# Altium footprint library 13-IC Packages-1bga.PcbLib: 97 footprints (part 13 of 14)
Each footprint in its own frame and in the unit in brackets; x right, y up, seen from the top. Pads: shape width x height; smd on the part's side, far side on the other; paste and mask are expansions set on the pad; w line width, h text height; cw(c..) or ccw(c..) is an arc to the next point about the centre after c.
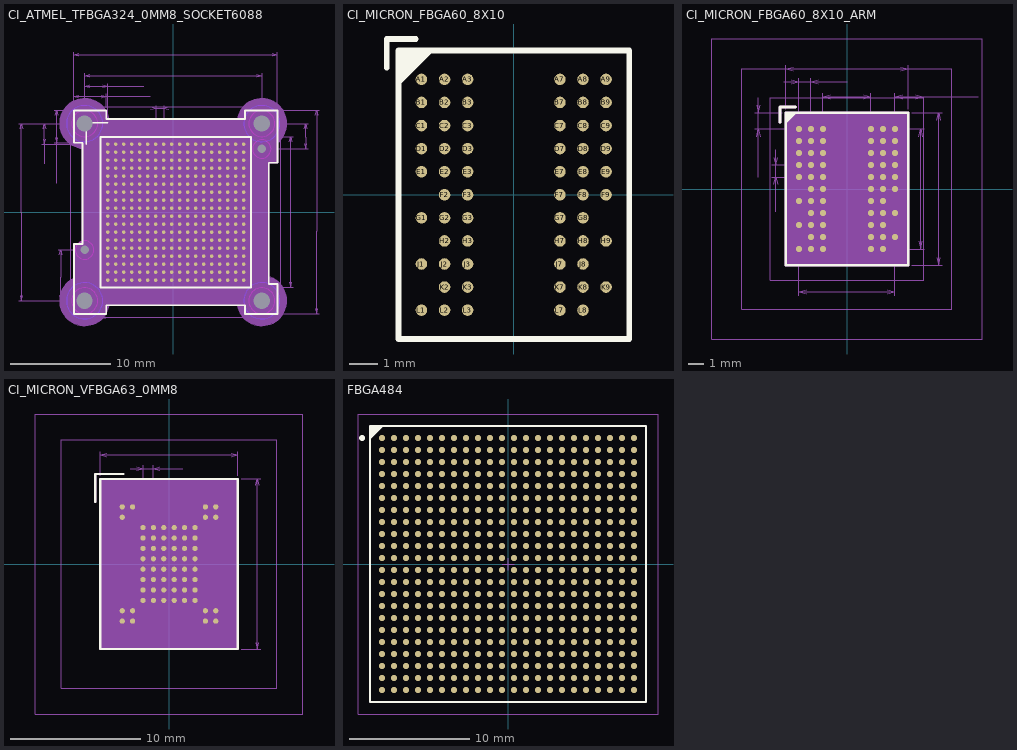
[diagram p12: the footprints below, top view; thin cyan lines are the x and y axes]

## CI_ATMEL_TFBGA324_0MM8_SOCKET6088 [mm]
height 25.75
pads (330):
  round 1 / inner round 1.61 / far side round 1 hole 1.61: " "(-8.863,-8.863) " "(-8.863,8.863) " "(8.863,-8.863) " "(8.863,8.863)
  round 0.5 / inner round 0.85 / far side round 0.5 hole 0.85: " "(-8.863,-3.783) " "(8.862,6.323)
  round 0.35 smd: A1(-6.553,6.8) A2(-5.753,6.8) A3(-4.953,6.8) A4(-4.152,6.8) A5(-3.353,6.8) A6(-2.553,6.8) A7(-1.752,6.8) A8(-0.953,6.8) A9(-0.153,6.8) A10(0.647,6.8) A11(1.448,6.8) A12(2.247,6.8) A13(3.047,6.8) A14(3.848,6.8) A15(4.647,6.8) A16(5.447,6.8) A17(6.247,6.8) A18(7.048,6.8) B1(-6.553,6) B2(-5.753,6) B3(-4.953,6) B4(-4.152,6) B5(-3.352,6) B6(-2.553,6) B7(-1.753,6) B8(-0.953,6) B9(-0.153,6) B10(0.647,6) B11(1.448,6) B12(2.248,6) B13(3.047,6) B14(3.847,6) B15(4.647,6) B16(5.447,6) B17(6.248,6) B18(7.048,6) C1(-6.553,5.2) C2(-5.753,5.2) C3(-4.953,5.2) C4(-4.152,5.2) C5(-3.352,5.2) C6(-2.553,5.2) C7(-1.753,5.2) C8(-0.953,5.2) C9(-0.153,5.2) C10(0.647,5.2) C11(1.448,5.2) C12(2.248,5.2) C13(3.047,5.2) C14(3.847,5.2) C15(4.647,5.2) C16(5.447,5.2) C17(6.247,5.2) C18(7.048,5.2) D1(-6.553,4.4) D2(-5.753,4.4) D3(-4.953,4.4) D4(-4.152,4.4) D5(-3.353,4.4) D6(-2.553,4.4) D7(-1.752,4.4) D8(-0.953,4.4) D9(-0.153,4.4) D10(0.647,4.4) D11(1.448,4.4) D12(2.247,4.4) D13(3.047,4.4) D14(3.848,4.4) D15(4.647,4.4) D16(5.447,4.4) D17(6.248,4.4) D18(7.048,4.4) E1(-6.552,3.6) E2(-5.753,3.6) E3(-4.953,3.6) E4(-4.153,3.6) E5(-3.353,3.6) E6(-2.553,3.6) E7(-1.752,3.6) E8(-0.952,3.6) E9(-0.153,3.6) E10(0.647,3.6) E11(1.447,3.6) E12(2.247,3.6) E13(3.047,3.6) E14(3.848,3.6) E15(4.648,3.6) E16(5.447,3.6) E17(6.247,3.6) E18(7.047,3.6) F1(-6.552,2.8) F2(-5.752,2.8) F3(-4.953,2.8) F4(-4.153,2.8) F5(-3.353,2.8) F6(-2.553,2.8) F7(-1.752,2.8) F8(-0.952,2.8) F9(-0.152,2.8) F10(0.647,2.8) F11(1.447,2.8) F12(2.247,2.8) F13(3.047,2.8) F14(3.848,2.8) F15(4.648,2.8) F16(5.448,2.8) F17(6.247,2.8) F18(7.047,2.8) G1(-6.552,2) G2(-5.753,2) G3(-4.953,2) G4(-4.153,2) G5(-3.353,2) G6(-2.553,2) G7(-1.752,2) G8(-0.952,2) G9(-0.153,2) G10(0.647,2) G11(1.447,2) G12(2.247,2) G13(3.047,2) G14(3.848,2) G15(4.648,2) G16(5.447,2) G17(6.247,2) G18(7.047,2) H1(-6.553,1.2) H2(-5.753,1.2) H3(-4.953,1.2) H4(-4.152,1.2) H5(-3.353,1.2) H6(-2.553,1.2) H7(-1.752,1.2) H8(-0.953,1.2) H9(-0.153,1.2) H10(0.647,1.2) H11(1.448,1.2) H12(2.247,1.2) H13(3.047,1.2) H14(3.848,1.2) H15(4.647,1.2) H16(5.447,1.2) H17(6.247,1.2) H18(7.048,1.2) J1(-6.553,0.4) J2(-5.753,0.4) J3(-4.953,0.4) J4(-4.152,0.4) J5(-3.352,0.4) J6(-2.553,0.4) J7(-1.753,0.4) J8(-0.953,0.4) J9(-0.153,0.4) J10(0.647,0.4) J11(1.448,0.4) J12(2.248,0.4) J13(3.047,0.4) J14(3.847,0.4) J15(4.647,0.4) J16(5.447,0.4) J17(6.247,0.4) J18(7.048,0.4) K1(-6.553,-0.4) K2(-5.753,-0.4) K3(-4.953,-0.4) K4(-4.152,-0.4) K5(-3.352,-0.4) K6(-2.553,-0.4) K7(-1.753,-0.4) K8(-0.953,-0.4) K9(-0.153,-0.4) K10(0.647,-0.4) K11(1.448,-0.4) K12(2.248,-0.4) K13(3.047,-0.4) K14(3.847,-0.4) K15(4.647,-0.4) K16(5.447,-0.4) K17(6.248,-0.4) K18(7.048,-0.4) L1(-6.553,-1.2) L2(-5.753,-1.2) L3(-4.953,-1.2) L4(-4.152,-1.2) L5(-3.353,-1.2) L6(-2.553,-1.2) L7(-1.752,-1.2) L8(-0.953,-1.2) L9(-0.153,-1.2) L10(0.647,-1.2) L11(1.448,-1.2) L12(2.247,-1.2) L13(3.047,-1.2) L14(3.848,-1.2) L15(4.647,-1.2) L16(5.447,-1.2) L17(6.247,-1.2) L18(7.048,-1.2) M1(-6.552,-2) M2(-5.753,-2) M3(-4.953,-2) M4(-4.153,-2) M5(-3.353,-2) M6(-2.553,-2) M7(-1.752,-2) M8(-0.952,-2) M9(-0.153,-2) M10(0.647,-2) M11(1.447,-2) M12(2.247,-2) M13(3.047,-2) M14(3.848,-2) M15(4.648,-2) M16(5.447,-2) M17(6.248,-2) M18(7.047,-2) N1(-6.552,-2.8) N2(-5.752,-2.8) N3(-4.953,-2.8) N4(-4.153,-2.8) N5(-3.353,-2.8) N6(-2.553,-2.8) N7(-1.752,-2.8) N8(-0.952,-2.8) N9(-0.152,-2.8) N10(0.647,-2.8) N11(1.447,-2.8) N12(2.247,-2.8) N13(3.047,-2.8) N14(3.848,-2.8) N15(4.648,-2.8) N16(5.448,-2.8) N17(6.247,-2.8) N18(7.047,-2.8) P1(-6.552,-3.6) P2(-5.753,-3.6) P3(-4.953,-3.6) P4(-4.153,-3.6) P5(-3.353,-3.6) P6(-2.553,-3.6) P7(-1.752,-3.6) P8(-0.952,-3.6) P9(-0.153,-3.6) P10(0.647,-3.6) P11(1.447,-3.6) P12(2.247,-3.6) P13(3.047,-3.6) P14(3.848,-3.6) P15(4.648,-3.6) P16(5.447,-3.6) P17(6.247,-3.6) P18(7.047,-3.6) R1(-6.553,-4.4) R2(-5.753,-4.4) R3(-4.953,-4.4) R4(-4.152,-4.4) R5(-3.353,-4.4) R6(-2.553,-4.4) R7(-1.752,-4.4) R8(-0.953,-4.4) R9(-0.153,-4.4) R10(0.647,-4.4) R11(1.448,-4.4) R12(2.247,-4.4) R13(3.047,-4.4) R14(3.848,-4.4) R15(4.647,-4.4) R16(5.447,-4.4) R17(6.247,-4.4) R18(7.048,-4.4) T1(-6.553,-5.2) T2(-5.753,-5.2) T3(-4.953,-5.2) T4(-4.152,-5.2) T5(-3.352,-5.2) T6(-2.553,-5.2) T7(-1.753,-5.2) T8(-0.953,-5.2) T9(-0.153,-5.2) T10(0.647,-5.2) T11(1.448,-5.2) T12(2.248,-5.2) T13(3.047,-5.2) T14(3.847,-5.2) T15(4.647,-5.2) T16(5.447,-5.2) T17(6.247,-5.2) T18(7.048,-5.2) U1(-6.553,-6) U2(-5.753,-6) U3(-4.953,-6) U4(-4.152,-6) U5(-3.352,-6) U6(-2.553,-6) U7(-1.753,-6) U8(-0.953,-6) U9(-0.153,-6) U10(0.647,-6) U11(1.448,-6) U12(2.248,-6) U13(3.047,-6) U14(3.847,-6) U15(4.647,-6) U16(5.447,-6) U17(6.247,-6) U18(7.048,-6) V1(-6.553,-6.8) V2(-5.753,-6.8) V3(-4.953,-6.8) V4(-4.152,-6.8) V5(-3.353,-6.8) V6(-2.553,-6.8) V7(-1.752,-6.8) V8(-0.953,-6.8) V9(-0.153,-6.8) V10(0.647,-6.8) V11(1.448,-6.8) V12(2.247,-6.8) V13(3.047,-6.8) V14(3.848,-6.8) V15(4.647,-6.8) V16(5.447,-6.8) V17(6.247,-6.8) V18(7.048,-6.8)
Top Layer keep-out:
  circle w0.025: c-8.863,-8.863 r1.805
  circle w0.025: c8.863,-8.863 r1.805
  circle w0.025: c8.863,8.863 r1.805
  circle w0.025: c-8.863,8.863 r1.805
Bottom Layer keep-out:
  circle w0.025: c-8.863,-8.863 r1.805
  circle w0.025: c8.863,-8.863 r1.805
  circle w0.025: c8.863,8.863 r1.805
  circle w0.025: c-8.863,8.863 r1.805
Top Overlay:
  lines w0.18: -8.703,6.8 -8.703,8.95 -6.552,8.95 ; -9.927,-10.175 -9.927,-3.185 -9.062,-3.185 -9.062,6.94 -9.927,6.94 -9.927,10.175 -6.692,10.175 -6.693,9.31 7.188,9.31 7.187,10.175 10.422,10.175 10.422,4.94 9.558,4.94 9.557,-7.185 10.422,-7.185 10.422,-10.175 7.187,-10.175 7.188,-9.31 -6.693,-9.31 -6.692,-10.175 -9.927,-10.175 ; -7.278,-7.525 -7.278,7.525 7.773,7.525 7.773,-7.525 -7.278,-7.525
Top Solder:
  drawing of 6 lines, arcs and shapes, not listed
Bottom Solder:
  drawing of 6 lines, arcs and shapes, not listed
Mechanical 6:
  lines w0.18: -8.703,6.8 -8.703,8.089 ; -8.077,8.95 -6.552,8.95 ; -9.927,-10.175 -9.927,-3.185 -9.062,-3.185 -9.062,6.94 -9.927,6.94 -9.927,10.175 -6.692,10.175 -6.693,9.31 7.188,9.31 7.187,10.175 10.422,10.175 10.422,4.94 9.558,4.94 9.557,-7.185 10.422,-7.185 10.422,-10.175 7.187,-10.175 7.188,-9.31 -6.693,-9.31 -6.692,-10.175 -9.927,-10.175 ; -7.278,-7.525 -7.278,7.525 7.773,7.525 7.773,-7.525 -7.278,-7.525
Mechanical 8:
  lines w0.025: -15.428,-8.865 -9.112,-8.865 -12.982,-8.865 ; -15.428,8.86 -9.113,8.86 -13.128,8.86 ; -15.303,-8.365 -15.177,-8.865 ; -15.302,8.36 -15.178,8.86 ; -15.053,-8.365 -15.177,-8.865 ; -15.052,8.36 -15.178,8.86 ; -13.128,6.8 -6.803,6.8 ; -13.002,7.3 -12.878,6.8 ; -13.003,8.36 -12.877,8.86 ; -12.877,4.853 -12.878,6.8 ; -12.753,7.3 -12.878,6.8 ; -12.753,8.36 -12.877,8.86 ; -11.923,6.94 -10.178,6.94 ; -11.923,10.175 -10.178,10.175 ; -11.798,7.44 -11.672,6.94 ; -11.798,9.675 -11.672,10.175 ; -11.673,2.89 -11.672,6.94 ; -11.548,7.44 -11.672,6.94 ; -11.548,9.675 -11.672,10.175 ; -11.503,-8.862 -9.113,-8.863 ; -11.503,-3.782 -9.113,-3.783 ; -11.377,-8.363 -11.253,-8.863 ; -11.377,-4.283 -11.253,-3.783 ; -11.128,-8.362 -11.253,-8.863 ; -11.128,-4.282 -11.253,-3.783 ; -9.927,11.83 -9.927,10.425 -9.927,16.01 ; -9.428,11.455 -9.927,11.58 ; -9.427,11.705 -9.927,11.58 ; -9.428,15.635 -9.927,15.76 ; -9.428,15.885 -9.927,15.76 ; -8.863,12.85 -8.863,9.11 -8.863,13.915 ; -8.362,12.475 -8.863,12.6 ; -8.363,12.725 -8.863,12.6 ; -8.363,13.54 -8.863,13.665 ; -8.363,13.79 -8.863,13.665 ; -7.278,-10.75 -7.277,-7.775 ; -7.193,11.455 -6.692,11.58 ; -7.193,11.705 -6.692,11.58 ; -7.052,12.475 -6.553,12.6 ; -7.052,12.725 -6.553,12.6 ; -6.777,-10.625 -7.278,-10.5 ; -6.778,-10.375 -7.278,-10.5 ; -6.692,10.425 -6.692,11.83 ; -6.552,7.05 -6.552,12.85 ; -2.965,12.6 -6.553,12.6 ; -2.277,11.58 -6.692,11.58 ; -2.252,10.295 -1.753,10.42 ; -2.252,10.545 -1.753,10.42 ; -1.752,7.05 -1.752,10.67 ; -0.952,7.05 -0.953,10.67 ; -0.452,10.295 -0.953,10.42 ; -0.452,10.545 -0.953,10.42 ; 7.272,-10.625 7.773,-10.5 ; 7.273,-10.375 7.773,-10.5 ; 7.773,-10.75 7.772,-7.775 ; 8.022,-7.525 11.997,-7.525 ; 8.022,7.525 11.997,7.525 ; 8.362,13.54 8.862,13.665 ; 8.363,13.79 8.862,13.665 ; 8.863,9.11 8.862,13.915 ; 9.112,6.323 13.497,6.322 ; 9.112,8.862 13.497,8.863 ; 9.922,15.635 10.422,15.76 ; 9.922,15.885 10.422,15.76 ; 10.422,10.425 10.422,16.01 ; 10.673,-10.175 14.587,-10.175 ; 10.673,10.175 14.587,10.175 ; 11.623,-7.025 11.747,-7.525 ; 11.623,7.025 11.747,7.525 ; 11.872,-7.025 11.747,-7.525 ; 11.872,7.025 11.747,7.525 ; 13.122,6.822 13.248,6.323 ; 13.122,8.363 13.248,8.862 ; 13.372,6.823 13.248,6.323 ; 13.373,8.363 13.248,8.862 ; 14.212,-9.675 14.337,-10.175 ; 14.212,9.675 14.337,10.175 ; 14.463,-9.675 14.337,-10.175 ; 14.463,9.675 14.337,10.175 ; -15.177,-8.865 -15.178,-0.05 -15.178,8.86 ; -12.878,6.8 -12.877,8.86 ; -12.878,6.8 -12.877,8.86 ; -11.672,6.94 -11.672,10.175 ; -11.672,6.94 -11.672,10.175 ; -11.253,-8.863 -11.252,-6.5 -11.253,-3.783 ; -9.927,11.58 -6.692,11.58 ; -9.927,11.58 -6.692,11.58 ; -9.927,15.76 -0.332,15.76 10.422,15.76 ; -8.863,12.6 -6.553,12.6 ; -8.863,12.6 -6.553,12.6 ; -8.863,13.665 1.088,13.665 8.862,13.665 ; -7.278,-10.5 -0.253,-10.5 7.773,-10.5 ; -1.753,10.42 -1.188,10.42 -0.953,10.42 ; 11.747,-7.525 11.747,-1 11.747,7.525 ; 13.248,6.323 13.248,7.5 13.248,8.862 ; 14.337,-10.175 14.338,-1.925 14.337,10.175
  text "17.725" at -15.428,-1.413 h0.5
  text "2.31" at -5.115,12.85 h0.5
  text "17.725" at -0.275,13.915 h0.5
  text "2.06" at -13.128,5.227 h0.5
  text "20.35" at -1.457,16.01 h0.5
  text "20.35" at 14.087,-3.05 h0.5
  text "0.8" at -1.837,10.67 h0.5
  text "3.235" at -11.923,3.265 h0.5
  text "3.235" at -4.903,11.83 h0.5
  text "15.05" at 11.497,-2.125 h0.5
  text "2.54" at 12.563,6.613 h0.5
Mechanical 16:
  drawing of 43 lines, arcs and shapes, not listed
Multi-Layer keep-out:
  circle w0.025: c-8.863,-8.863 r1.305
  circle w0.025: c8.863,-8.863 r1.305
  circle w0.025: c8.863,8.863 r1.305
  circle w0.025: c-8.863,8.863 r1.305
  circle w0.025: c-8.863,-3.783 r0.925
  circle w0.025: c8.862,6.323 r0.925
Mechanical 18:
  text "V5" at -3.211,-6.659 h0.25
  text "N7" at -1.611,-2.659 h0.25
  text "T6" at -2.411,-5.059 h0.25
  text "U6" at -2.411,-5.859 h0.25
  text "E4" at -4.011,3.741 h0.25
  text "B9" at -0.011,6.141 h0.25
  text "R11" at 1.66,-4.188 h0.25
  text "U10" at 0.86,-5.788 h0.25
  text "V10" at 0.86,-6.588 h0.25
  text "N10" at 0.86,-2.588 h0.25
  text "P10" at 0.86,-3.388 h0.25
  text "R10" at 0.86,-4.188 h0.25
  text "U15" at 4.86,-5.788 h0.25
  text "T17" at 6.46,-4.988 h0.25
  text "R17" at 6.46,-4.188 h0.25
  text "U16" at 5.66,-5.788 h0.25
  text "E17" at 6.46,3.812 h0.25
  text "F16" at 5.66,3.012 h0.25
  text "F17" at 6.46,3.012 h0.25
  text "E14" at 4.06,3.812 h0.25
  text "F15" at 4.86,3.012 h0.25
  text "F18" at 7.26,3.012 h0.25
  text "F14" at 4.06,3.012 h0.25
  text "F13" at 3.26,3.012 h0.25
  text "M14" at 4.06,-1.788 h0.25
  text "L13" at 3.26,-0.988 h0.25
  text "L12" at 2.46,-0.988 h0.25
  text "K13" at 3.26,-0.188 h0.25
  text "C3" at -4.811,5.341 h0.25
  text "G11" at 1.66,2.212 h0.25
  text "G10" at 0.86,2.212 h0.25
  text "F6" at -2.411,2.941 h0.25
  text "D16" at 5.66,4.612 h0.25
  text "H3" at -4.811,1.341 h0.25
  text "H11" at 1.66,1.412 h0.25
  text "E18" at 7.26,3.812 h0.25
  text "G13" at 3.26,2.212 h0.25
  text "G12" at 2.46,2.212 h0.25
  text "D4" at -4.011,4.541 h0.25
  text "V13" at 3.26,-6.588 h0.25
  text "K10" at 0.86,-0.188 h0.25
  text "K9" at -0.011,-0.259 h0.25
  text "C2" at -5.611,5.341 h0.25
  text "P11" at 1.66,-3.388 h0.25
  text "V17" at 6.46,-6.588 h0.25
  text "U11" at 1.66,-5.788 h0.25
  text "E3" at -4.811,3.741 h0.25
  text "U18" at 7.26,-5.788 h0.25
  text "J15" at 4.86,0.612 h0.25
  text "J14" at 4.06,0.612 h0.25
  text "K17" at 6.46,-0.188 h0.25
  text "K18" at 7.26,-0.188 h0.25
  text "K16" at 5.66,-0.188 h0.25
  text "K15" at 4.86,-0.188 h0.25
  text "K14" at 4.06,-0.188 h0.25
  text "L17" at 6.46,-0.988 h0.25
  text "L18" at 7.26,-0.988 h0.25
  text "L16" at 5.66,-0.988 h0.25
  text "L15" at 4.86,-0.988 h0.25
  text "A16" at 5.66,7.012 h0.25
  text "M18" at 7.26,-1.788 h0.25
  text "L14" at 4.06,-0.988 h0.25
  text "M17" at 6.46,-1.788 h0.25
  text "K12" at 2.46,-0.188 h0.25
  text "K11" at 1.66,-0.188 h0.25
  text "J11" at 1.66,0.612 h0.25
  text "J10" at 0.86,0.612 h0.25
  text "J9" at -0.011,0.541 h0.25
  text "H12" at 2.46,1.412 h0.25
  text "H10" at 0.86,1.412 h0.25
  text "H9" at -0.011,1.341 h0.25
  text "G9" at -0.011,2.141 h0.25
  text "U17" at 6.46,-5.788 h0.25
  text "U12" at 2.46,-5.788 h0.25
  text "J13" at 3.26,0.612 h0.25
  text "J12" at 2.46,0.612 h0.25
  text "H13" at 3.26,1.412 h0.25
  text "D3" at -4.811,4.541 h0.25
  text "C16" at 5.66,5.412 h0.25
  text "E8" at -0.811,3.741 h0.25
  text "E5" at -3.211,3.741 h0.25
  text "M16" at 5.66,-1.788 h0.25
  text "M15" at 4.86,-1.788 h0.25
  text "N14" at 4.06,-2.588 h0.25
  text "N18" at 7.26,-2.588 h0.25
  text "N17" at 6.46,-2.588 h0.25
  text "P18" at 7.26,-3.388 h0.25
  text "N16" at 5.66,-2.588 h0.25
  text "P9" at -0.011,-3.459 h0.25
  text "N15" at 4.86,-2.588 h0.25
  text "P14" at 4.06,-3.388 h0.25
  text "R14" at 4.06,-4.188 h0.25
  text "P17" at 6.46,-3.388 h0.25
  text "P16" at 5.66,-3.388 h0.25
  text "P15" at 4.86,-3.388 h0.25
  text "T14" at 4.06,-4.988 h0.25
  text "R15" at 4.86,-4.188 h0.25
  text "R16" at 5.66,-4.188 h0.25
  text "F8" at -0.811,2.941 h0.25
  text "G3" at -4.811,2.141 h0.25
  text "G7" at -1.611,2.141 h0.25
  text "V18" at 7.26,-6.588 h0.25
  text "F5" at -3.211,2.941 h0.25
  text "H5" at -3.211,1.341 h0.25
  text "G5" at -3.211,2.141 h0.25
  text "F4" at -4.011,2.941 h0.25
  text "G4" at -4.011,2.141 h0.25
  text "L2" at -5.611,-1.059 h0.25
  text "J7" at -1.611,0.541 h0.25
  text "K1" at -6.411,-0.259 h0.25
  text "L3" at -4.811,-1.059 h0.25
  text "K7" at -1.611,-0.259 h0.25
  text "K2" at -5.611,-0.259 h0.25
  text "T4" at -4.011,-5.059 h0.25
  text "J8" at -0.811,0.541 h0.25
  text "K5" at -3.211,-0.259 h0.25
  text "L6" at -2.411,-1.059 h0.25
  text "K8" at -0.811,-0.259 h0.25
  text "K4" at -4.011,-0.259 h0.25
  text "T3" at -4.811,-5.059 h0.25
  text "K6" at -2.411,-0.259 h0.25
  text "T2" at -5.611,-5.059 h0.25
  text "P5" at -3.211,-3.459 h0.25
  text "J1" at -6.411,0.541 h0.25
  text "M2" at -5.611,-1.859 h0.25
  text "K3" at -4.811,-0.259 h0.25
  text "J6" at -2.411,0.541 h0.25
  text "L5" at -3.211,-1.059 h0.25
  text "J4" at -4.011,0.541 h0.25
  text "N1" at -6.411,-2.659 h0.25
  text "J2" at -5.611,0.541 h0.25
  text "T1" at -6.411,-5.059 h0.25
  text "H4" at -4.011,1.341 h0.25
  text "M1" at -6.411,-1.859 h0.25
  text "J3" at -4.811,0.541 h0.25
  text "R3" at -4.811,-4.259 h0.25
  text "H6" at -2.411,1.341 h0.25
  text "H7" at -1.611,1.341 h0.25
  text "G8" at -0.811,2.141 h0.25
  text "L4" at -4.011,-1.059 h0.25
  text "J5" at -3.211,0.541 h0.25
  text "P8" at -0.811,-3.459 h0.25
  text "G6" at -2.411,2.141 h0.25
  text "H8" at -0.811,1.341 h0.25
  text "N8" at -0.811,-2.659 h0.25
  text "U7" at -1.611,-5.859 h0.25
  text "H2" at -5.611,1.341 h0.25
  text "T18" at 7.26,-4.988 h0.25
  text "A7" at -1.611,6.941 h0.25
  text "P7" at -1.611,-3.459 h0.25
  text "T13" at 3.26,-4.988 h0.25
  text "R13" at 3.26,-4.188 h0.25
  text "M7" at -1.611,-1.859 h0.25
  text "R18" at 7.26,-4.188 h0.25
  text "P13" at 3.26,-3.388 h0.25
  text "U5" at -3.211,-5.859 h0.25
  text "T5" at -3.211,-5.059 h0.25
  text "N9" at -0.011,-2.659 h0.25
  text "R5" at -3.211,-4.259 h0.25
  text "V6" at -2.411,-6.659 h0.25
  text "M11" at 1.66,-1.788 h0.25
  text "R6" at -2.411,-4.259 h0.25
  text "U13" at 3.26,-5.788 h0.25
  text "N11" at 1.66,-2.588 h0.25
  text "M8" at -0.811,-1.859 h0.25
  text "V4" at -4.011,-6.659 h0.25
  text "T12" at 2.46,-4.988 h0.25
  text "M13" at 3.26,-1.788 h0.25
  text "L8" at -0.811,-1.059 h0.25
  text "U14" at 4.06,-5.788 h0.25
  text "T11" at 1.66,-4.988 h0.25
  text "M12" at 2.46,-1.788 h0.25
  text "N12" at 2.46,-2.588 h0.25
  text "T16" at 5.66,-4.988 h0.25
  text "R12" at 2.46,-4.188 h0.25
  text "T15" at 4.86,-4.988 h0.25
  text "P12" at 2.46,-3.388 h0.25
  text "E10" at 0.86,3.812 h0.25
  text "N13" at 3.26,-2.588 h0.25
  text "D10" at 0.86,4.612 h0.25
  text "F11" at 1.66,3.012 h0.25
  text "A10" at 0.86,7.012 h0.25
  text "C9" at -0.011,5.341 h0.25
  text "A12" at 2.46,7.012 h0.25
  text "D11" at 1.66,4.612 h0.25
  text "B11" at 1.66,6.212 h0.25
  text "E11" at 1.66,3.812 h0.25
  text "A11" at 1.66,7.012 h0.25
  text "C11" at 1.66,5.412 h0.25
  text "A14" at 4.06,7.012 h0.25
  text "F12" at 2.46,3.012 h0.25
  text "V15" at 4.86,-6.588 h0.25
  text "F10" at 0.86,3.012 h0.25
  text "B12" at 2.46,6.212 h0.25
  text "A13" at 3.26,7.012 h0.25
  text "V12" at 2.46,-6.588 h0.25
  text "G15" at 4.86,2.212 h0.25
  text "R8" at -0.811,-4.259 h0.25
  text "H16" at 5.66,1.412 h0.25
  text "R2" at -5.611,-4.259 h0.25
  text "G14" at 4.06,2.212 h0.25
  text "V16" at 5.66,-6.588 h0.25
  text "G18" at 7.26,2.212 h0.25
  text "V11" at 1.66,-6.588 h0.25
  text "H17" at 6.46,1.412 h0.25
  text "J17" at 6.46,0.612 h0.25
  text "H15" at 4.86,1.412 h0.25
  text "M10" at 0.86,-1.788 h0.25
  text "H14" at 4.06,1.412 h0.25
  text "H18" at 7.26,1.412 h0.25
  text "J18" at 7.26,0.612 h0.25
  text "G16" at 5.66,2.212 h0.25
  text "G17" at 6.46,2.212 h0.25
  text "J16" at 5.66,0.612 h0.25
  text "V7" at -1.611,-6.659 h0.25
  text "F9" at -0.011,2.941 h0.25
  text "R7" at -1.611,-4.259 h0.25
  text "C8" at -0.811,5.341 h0.25
  text "B8" at -0.811,6.141 h0.25
  text "L9" at -0.011,-1.059 h0.25
  text "T9" at -0.011,-5.059 h0.25
  text "E1" at -6.411,3.741 h0.25
  text "F1" at -6.411,2.941 h0.25
  text "E2" at -5.611,3.741 h0.25
  text "G2" at -5.611,2.141 h0.25
  text "F3" at -4.811,2.941 h0.25
  text "V1" at -6.411,-6.659 h0.25
  text "D2" at -5.611,4.541 h0.25
  text "L10" at 0.86,-0.988 h0.25
  text "M9" at -0.011,-1.859 h0.25
  text "U4" at -4.011,-5.859 h0.25
  text "U9" at -0.011,-5.859 h0.25
  text "U1" at -6.411,-5.859 h0.25
  text "V3" at -4.811,-6.659 h0.25
  text "P4" at -4.011,-3.459 h0.25
  text "T7" at -1.611,-5.059 h0.25
  text "U2" at -5.611,-5.859 h0.25
  text "U3" at -4.811,-5.859 h0.25
  text "L1" at -6.411,-1.059 h0.25
  text "U8" at -0.811,-5.859 h0.25
  text "G1" at -6.411,2.141 h0.25
  text "N6" at -2.411,-2.659 h0.25
  text "V2" at -5.611,-6.659 h0.25
  text "R4" at -4.011,-4.259 h0.25
  text "P3" at -4.811,-3.459 h0.25
  text "R1" at -6.411,-4.259 h0.25
  text "N5" at -3.211,-2.659 h0.25
  text "N3" at -4.811,-2.659 h0.25
  text "N2" at -5.611,-2.659 h0.25
  text "V8" at -0.811,-6.659 h0.25
  text "P2" at -5.611,-3.459 h0.25
  text "M6" at -2.411,-1.859 h0.25
  text "M5" at -3.211,-1.859 h0.25
  text "T10" at 0.86,-4.988 h0.25
  text "P1" at -6.411,-3.459 h0.25
  text "L11" at 1.66,-0.988 h0.25
  text "N4" at -4.011,-2.659 h0.25
  text "T8" at -0.811,-5.059 h0.25
  text "L7" at -1.611,-1.059 h0.25
  text "R9" at -0.011,-4.259 h0.25
  text "M4" at -4.011,-1.859 h0.25
  text "F2" at -5.611,2.941 h0.25
  text "M3" at -4.811,-1.859 h0.25
  text "H1" at -6.411,1.341 h0.25
  text "C12" at 2.46,5.412 h0.25
  text "D12" at 2.46,4.612 h0.25
  text "D1" at -6.411,4.541 h0.25
  text "V9" at -0.011,-6.659 h0.25
  text "E12" at 2.46,3.812 h0.25
  text "B13" at 3.26,6.212 h0.25
  text "E13" at 3.26,3.812 h0.25
  text "C1" at -6.411,5.341 h0.25
  text "C13" at 3.26,5.412 h0.25
  text "D13" at 3.26,4.612 h0.25
  text "P6" at -2.411,-3.459 h0.25
  text "B14" at 4.06,6.212 h0.25
  text "A15" at 4.86,7.012 h0.25
  text "C14" at 4.06,5.412 h0.25
  text "D14" at 4.06,4.612 h0.25
  text "B15" at 4.86,6.212 h0.25
  text "B16" at 5.66,6.212 h0.25
  text "V14" at 4.06,-6.588 h0.25
  text "C15" at 4.86,5.412 h0.25
  text "D15" at 4.86,4.612 h0.25
  text "A17" at 6.46,7.012 h0.25
  text "C17" at 6.46,5.412 h0.25
  text "B10" at 0.86,6.212 h0.25
  text "C10" at 0.86,5.412 h0.25
  text "B17" at 6.46,6.212 h0.25
  text "A18" at 7.26,7.012 h0.25
  text "B18" at 7.26,6.212 h0.25
  text "C18" at 7.26,5.412 h0.25
  text "D17" at 6.46,4.612 h0.25
  text "D18" at 7.26,4.612 h0.25
  text "E16" at 5.66,3.812 h0.25
  text "E15" at 4.86,3.812 h0.25
  text "A9" at -0.011,6.941 h0.25
  text "D9" at -0.011,4.541 h0.25
  text "C7" at -1.611,5.341 h0.25
  text "A6" at -2.411,6.941 h0.25
  text "D8" at -0.811,4.541 h0.25
  text "B1" at -6.411,6.141 h0.25
  text "B3" at -4.811,6.141 h0.25
  text "B2" at -5.611,6.141 h0.25
  text "A2" at -5.611,6.941 h0.25
  text "A1" at -6.411,6.941 h0.25
  text "C4" at -4.011,5.341 h0.25
  text "A3" at -4.811,6.941 h0.25
  text "D5" at -3.211,4.541 h0.25
  text "E6" at -2.411,3.741 h0.25
  text "B4" at -4.011,6.141 h0.25
  text "C5" at -3.211,5.341 h0.25
  text "A4" at -4.011,6.941 h0.25
  text "F7" at -1.611,2.941 h0.25
  text "D6" at -2.411,4.541 h0.25
  text "B5" at -3.211,6.141 h0.25
  text "E7" at -1.611,3.741 h0.25
  text "C6" at -2.411,5.341 h0.25
  text "D7" at -1.611,4.541 h0.25
  text "A5" at -3.211,6.941 h0.25
  text "B7" at -1.611,6.141 h0.25
  text "B6" at -2.411,6.141 h0.25
  text "E9" at -0.011,3.741 h0.25
  text "A8" at -0.811,6.941 h0.25
Mechanical 20:
  text ".Designator" at 0.772,1.231 h1.12
Mechanical 29:
  text "3MM" at -1.253,-8.5 h0.5
3D body "tfbga-324.stp": height 1.2, standoff 0, extent -7.271,-7.5 7.729,7.5

## CI_MICRON_FBGA60_8X10 [mm]
height 25.75
pads (99):
  round 0.4 smd: A1(-3.2,4) A2(-2.4,4) A3(-1.6,4) A7(1.6,4) A8(2.4,4) A9(3.2,4) B1(-3.2,3.2) B2(-2.4,3.2) B3(-1.6,3.2) B7(1.6,3.2) B8(2.4,3.2) B9(3.2,3.2) C1(-3.2,2.4) C2(-2.4,2.4) C3(-1.6,2.4) C7(1.6,2.4) C8(2.4,2.4) C9(3.2,2.4) D1(-3.2,1.6) D2(-2.4,1.6) D3(-1.6,1.6) D7(1.6,1.6) D8(2.4,1.6) D9(3.2,1.6) E1(-3.2,0.8) E2(-2.4,0.8) E3(-1.6,0.8) E7(1.6,0.8) E8(2.4,0.8) E9(3.2,0.8) F2(-2.4,0) F3(-1.6,0) F7(1.6,0) F8(2.4,0) F9(3.2,0) G1(-3.2,-0.8) G2(-2.4,-0.8) G3(-1.6,-0.8) G7(1.6,-0.8) G8(2.4,-0.8) H2(-2.4,-1.6) H3(-1.6,-1.6) H7(1.6,-1.6) H8(2.4,-1.6) H9(3.2,-1.6) J1(-3.2,-2.4) J2(-2.4,-2.4) J3(-1.6,-2.4) J7(1.6,-2.4) J8(2.4,-2.4) K2(-2.4,-3.2) K3(-1.6,-3.2) K7(1.6,-3.2) K8(2.4,-3.2) K9(3.2,-3.2) L1(-3.2,-4) L2(-2.4,-4) L3(-1.6,-4) L7(1.6,-4) L8(2.4,-4)
  round 0 all layers, no hole: A4(-0.8,4) A5(0,4) A6(0.8,4) B4(-0.8,3.2) B5(0,3.2) B6(0.8,3.2) C4(-0.8,2.4) C5(0,2.4) C6(0.8,2.4) D4(-0.8,1.6) D5(0,1.6) D6(0.8,1.6) E4(-0.8,0.8) E5(0,0.8) E6(0.8,0.8) F1(-3.2,0) F4(-0.8,0) F5(0,0) F6(0.8,0) G4(-0.8,-0.8) G5(0,-0.8) G6(0.8,-0.8) G9(3.2,-0.8) H1(-3.2,-1.6) H4(-0.8,-1.6) H5(0,-1.6) H6(0.8,-1.6) J4(-0.8,-2.4) J5(0,-2.4) J6(0.8,-2.4) J9(3.2,-2.4) K1(-3.2,-3.2) K4(-0.8,-3.2) K5(0,-3.2) K6(0.8,-3.2) L4(-0.8,-4) L5(0,-4) L6(0.8,-4) L9(3.2,-4)
Top Overlay:
  lines w0.2: -4.4,4.4 -4.4,5.4 -3.4,5.4 ; -4,3.9 -2.925,4.975 ; -4,4.5 -3.575,4.925 ; -4,4.65 -3.7,4.95 ; -3.95,4.1 -3.075,4.975 ; -3.95,4.3 -3.3,4.95 ; -3.95,4.85 -3.85,4.95 ; -4,-5 4,-5 4,5 -4,5 -4,-5

## CI_MICRON_FBGA60_8X10_ARM [mm]
height 25.75
pads (60):
  round 0.4 smd: A1(-3.2,4) A2(-2.4,4) A3(-1.6,4) A7(1.6,4) A8(2.4,4) A9(3.2,4) B1(-3.2,3.2) B2(-2.4,3.2) B3(-1.6,3.2) B7(1.6,3.2) B8(2.4,3.2) B9(3.2,3.2) C1(-3.2,2.4) C2(-2.4,2.4) C3(-1.6,2.4) C7(1.6,2.4) C8(2.4,2.4) C9(3.2,2.4) D1(-3.2,1.6) D2(-2.4,1.6) D3(-1.6,1.6) D7(1.6,1.6) D8(2.4,1.6) D9(3.2,1.6) E1(-3.2,0.8) E2(-2.4,0.8) E3(-1.6,0.8) E7(1.6,0.8) E8(2.4,0.8) E9(3.2,0.8) F2(-2.4,0) F3(-1.6,0) F7(1.6,0) F8(2.4,0) F9(3.2,0) G1(-3.2,-0.8) G2(-2.4,-0.8) G3(-1.6,-0.8) G7(1.6,-0.8) G8(2.4,-0.8) H2(-2.4,-1.6) H3(-1.6,-1.6) H7(1.6,-1.6) H8(2.4,-1.6) H9(3.2,-1.6) J1(-3.2,-2.4) J2(-2.4,-2.4) J3(-1.6,-2.4) J7(1.6,-2.4) J8(2.4,-2.4) K2(-2.4,-3.2) K3(-1.6,-3.2) K7(1.6,-3.2) K8(2.4,-3.2) K9(3.2,-3.2) L1(-3.2,-4) L2(-2.4,-4) L3(-1.6,-4) L7(1.6,-4) L8(2.4,-4)
Top Overlay:
  region: -4.089,4.343 -3.378,5.055 -3.378,5.105 -4.064,5.105 -4.089,5.08
  lines w0.18: -4.465,4.445 -4.465,5.465 -3.429,5.465 ; -4.075,-5.075 -4.075,5.075 4.075,5.075 4.075,-5.075 -4.075,-5.075
Mechanical 6:
  lines w0.18: -4.465,4.445 -4.465,5.465 -3.429,5.465 ; -4.075,-5.075 -4.075,5.075 4.075,5.075 4.075,-5.075 -4.075,-5.075
Mechanical 8:
  lines w0.025: -6.15,4 -3.45,4 ; -6.15,5.075 -4.325,5.075 ; -6.025,3.5 -5.9,4 ; -6.025,5.575 -5.9,5.075 ; -5.9,0.8 -5.9,4 ; -5.9,6.075 -5.9,5.075 ; -5.775,3.5 -5.9,4 ; -5.775,5.575 -5.9,5.075 ; -5,0.8 -3.45,0.8 ; -5,1.6 -3.45,1.6 ; -4.875,0.3 -4.75,0.8 ; -4.875,2.1 -4.75,1.6 ; -4.75,-1.525 -4.75,0.8 ; -4.75,2.6 -4.75,1.6 ; -4.625,0.3 -4.75,0.8 ; -4.625,2.1 -4.75,1.6 ; -4.2,7.15 -3.2,7.15 ; -4.075,5.325 -4.075,8.25 ; -3.7,7.025 -3.2,7.15 ; -3.7,7.275 -3.2,7.15 ; -3.575,7.875 -4.075,8 ; -3.575,8.125 -4.075,8 ; -3.2,-7.1 -3.2,-4.25 ; -3.2,4.25 -3.2,7.4 ; -2.7,-6.975 -3.2,-6.85 ; -2.7,-6.725 -3.2,-6.85 ; -2.4,4.25 -2.4,7.4 ; -1.9,7.025 -2.4,7.15 ; -1.9,7.275 -2.4,7.15 ; -1.6,4.25 -1.6,6.4 ; -1.1,6.025 -1.6,6.15 ; -1.1,6.275 -1.6,6.15 ; 0.025,7.15 -2.4,7.15 ; 1.1,6.025 1.6,6.15 ; 1.1,6.275 1.6,6.15 ; 1.6,4.25 1.6,6.4 ; 2.65,-4 5.15,-4 ; 2.7,-6.975 3.2,-6.85 ; 2.7,-6.725 3.2,-6.85 ; 3.2,-7.1 3.2,-3.45 ; 3.2,4.25 3.2,6.4 ; 3.45,4 5.15,4 ; 3.575,7.875 4.075,8 ; 3.575,8.125 4.075,8 ; 3.7,6.025 3.2,6.15 ; 3.7,6.275 3.2,6.15 ; 4.075,5.325 4.075,8.25 ; 4.325,-5.075 6.35,-5.075 ; 4.325,5.075 6.35,5.075 ; 4.575,6.025 5.075,6.15 ; 4.575,6.275 5.075,6.15 ; 4.775,-3.5 4.9,-4 ; 4.775,3.5 4.9,4 ; 5.025,-3.5 4.9,-4 ; 5.025,3.5 4.9,4 ; 5.975,-4.575 6.1,-5.075 ; 5.975,4.575 6.1,5.075 ; 6.225,-4.575 6.1,-5.075 ; 6.225,4.575 6.1,5.075 ; 8.75,6.15 5.075,6.15 ; -5.9,4 -5.9,5.075 ; -4.75,0.8 -4.75,1.6 ; -4.075,8 0.25,8 4.075,8 ; -3.2,-6.85 0,-6.85 3.2,-6.85 ; -3.2,7.15 -2.4,7.15 ; -1.6,6.15 0,6.15 1.6,6.15 ; 3.2,6.15 5.075,6.15 ; 3.2,6.15 5.075,6.15 ; 4.9,-4 4.9,0.8 4.9,4 ; 6.1,-5.075 6.1,-0.1 6.1,5.075
  text "0.8" at -1.65,7.4 h0.5
  text "3.2" at -0.65,6.4 h0.5
  text "1.875" at 6.125,6.4 h0.5
  text "6.4" at -0.65,-6.6 h0.5
  text "10.15" at 5.85,-1.225 h0.5
  text "1.075" at -6.15,1.175 h0.5
  text "8" at 4.65,0.625 h0.5
  text "0.8" at -4.25,-1.5 h0.5
  text "8.15" at -1.188,9.15 h0.5
Mechanical 16:
  circle w0.025: c-3.2,4 r0.4
  region: -4.075,5.075 4.075,5.075 4.075,-5.075 -4.075,-5.075
  lines w0.025: -9,-10 -9,10 9,10 9,-10 -9,-10 ; -7,-8 -7,8 7,8 7,-8 -7,-8 ; -5.1,-6.1 -5.1,6.1 5.1,6.1 5.1,-6.1 -5.1,-6.1 ; -4.075,-5.075 -4.075,5.075 4.075,5.075 4.075,-5.075 -4.075,-5.075
Mechanical 18:
  text "L2" at -2.2,-4 h0.25
  text "L8" at 2.6,-4 h0.25
  text "B3" at -1.4,3.2 h0.25
  text "B7" at 1.8,3.2 h0.25
  text "F7" at 1.8,0 h0.25
  text "G8" at 2.6,-0.8 h0.25
  text "G7" at 1.8,-0.8 h0.25
  text "F3" at -1.4,0 h0.25
  text "F8" at 2.6,0 h0.25
  text "E8" at 2.6,0.8 h0.25
  text "G3" at -1.4,-0.8 h0.25
  text "F2" at -2.2,0 h0.25
  text "G2" at -2.2,-0.8 h0.25
  text "B9" at 3.4,3.2 h0.25
  text "B1" at -3,3.2 h0.25
  text "D9" at 3.4,1.6 h0.25
  text "D1" at -3,1.6 h0.25
  text "D3" at -1.4,1.6 h0.25
  text "D7" at 1.8,1.6 h0.25
  text "C2" at -2.2,2.4 h0.25
  text "C8" at 2.6,2.4 h0.25
  text "E2" at -2.2,0.8 h0.25
  text "K9" at 3.4,-3.2 h0.25
  text "J1" at -3,-2.4 h0.25
  text "F9" at 3.4,0 h0.25
  text "E7" at 1.8,0.8 h0.25
  text "E3" at -1.4,0.8 h0.25
  text "D8" at 2.6,1.6 h0.25
  text "D2" at -2.2,1.6 h0.25
  text "B8" at 2.6,3.2 h0.25
  text "B2" at -2.2,3.2 h0.25
  text "A7" at 1.8,4 h0.25
  text "A3" at -1.4,4 h0.25
  text "L1" at -3,-4 h0.25
  text "H9" at 3.4,-1.6 h0.25
  text "E9" at 3.4,0.8 h0.25
  text "E1" at -3,0.8 h0.25
  text "C9" at 3.4,2.4 h0.25
  text "C7" at 1.8,2.4 h0.25
  text "C3" at -1.4,2.4 h0.25
  text "C1" at -3,2.4 h0.25
  text "A9" at 3.4,4 h0.25
  text "A1" at -3,4 h0.25
  text "K7" at 1.8,-3.2 h0.25
  text "H2" at -2.2,-1.6 h0.25
  text "K3" at -1.4,-3.2 h0.25
  text "K8" at 2.6,-3.2 h0.25
  text "K2" at -2.2,-3.2 h0.25
  text "J7" at 1.8,-2.4 h0.25
  text "J3" at -1.4,-2.4 h0.25
  text "J8" at 2.6,-2.4 h0.25
  text "J2" at -2.2,-2.4 h0.25
  text "H7" at 1.8,-1.6 h0.25
  text "H3" at -1.4,-1.6 h0.25
  text "H8" at 2.6,-1.6 h0.25
  text "A2" at -2.2,4 h0.25
  text "L7" at 1.8,-4 h0.25
  text "L3" at -1.4,-4 h0.25
  text "G1" at -3,-0.8 h0.25
  text "A8" at 2.6,4 h0.25
Mechanical 20:
  text ".Designator" at 1.241,0.5 h1.12
Mechanical 29:
  text "3MM" at -6.1,-7.5 h0.5
  text "5MM" at -8.8,-8.3 h0.5
3D body "fbga60-8x10.stp": height 1, standoff 0, extent -4.075,-5.075 4.075,5.075

## CI_MICRON_VFBGA63_0MM8 [mm]
height 25.75
pads (63):
  round 0.4 smd: A1(-3.6,4.4) A2(-2.8,4.4) A9(2.8,4.4) A10(3.6,4.4) B1(-3.6,3.6) B9(2.8,3.6) B10(3.6,3.6) C3(-2,2.8) C4(-1.2,2.8) C5(-0.4,2.8) C6(0.4,2.8) C7(1.2,2.8) C8(2,2.8) D3(-2,2) D4(-1.2,2) D5(-0.4,2) D6(0.4,2) D7(1.2,2) D8(2,2) E3(-2,1.2) E4(-1.2,1.2) E5(-0.4,1.2) E6(0.4,1.2) E7(1.2,1.2) E8(2,1.2) F3(-2,0.4) F4(-1.2,0.4) F5(-0.4,0.4) F6(0.4,0.4) F7(1.2,0.4) F8(2,0.4) G3(-2,-0.4) G4(-1.2,-0.4) G5(-0.4,-0.4) G6(0.4,-0.4) G7(1.2,-0.4) G8(2,-0.4) H3(-2,-1.2) H4(-1.2,-1.2) H5(-0.4,-1.2) H6(0.4,-1.2) H7(1.2,-1.2) H8(2,-1.2) J3(-2,-2) J4(-1.2,-2) J5(-0.4,-2) J6(0.4,-2) J7(1.2,-2) J8(2,-2) K3(-2,-2.8) K4(-1.2,-2.8) K5(-0.4,-2.8) K6(0.4,-2.8) K7(1.2,-2.8) K8(2,-2.8) L1(-3.6,-3.6) L2(-2.8,-3.6) L9(2.8,-3.6) L10(3.6,-3.6) M1(-3.6,-4.4) M2(-2.8,-4.4) M9(2.8,-4.4) M10(3.6,-4.4)
Top Overlay:
  lines w0.18: -5.675,4.775 -5.675,6.925 -3.525,6.925 ; -5.3,-6.55 -5.3,6.55 5.3,6.55 5.3,-6.55 -5.3,-6.55
Mechanical 6:
  lines w0.18: -5.675,4.775 -5.675,6.925 -3.525,6.925 ; -5.3,-6.55 -5.3,6.55 5.3,6.55 5.3,-6.55 -5.3,-6.55
Mechanical 8:
  lines w0.025: -5.3,6.8 -5.3,8.65 ; -4.8,8.275 -5.3,8.4 ; -4.8,8.525 -5.3,8.4 ; -3,7.35 -2,7.35 ; -2.5,7.225 -2,7.35 ; -2.5,7.475 -2,7.35 ; -2,3.05 -2,7.6 ; -1.2,3.05 -1.2,7.6 ; -0.7,7.225 -1.2,7.35 ; -0.7,7.475 -1.2,7.35 ; 1.075,7.35 -1.2,7.35 ; 4.8,8.275 5.3,8.4 ; 4.8,8.525 5.3,8.4 ; 5.3,6.8 5.3,8.65 ; 5.55,-6.55 7.05,-6.55 ; 5.55,6.55 7.05,6.55 ; 6.675,-6.05 6.8,-6.55 ; 6.675,6.05 6.8,6.55 ; 6.925,-6.05 6.8,-6.55 ; 6.925,6.05 6.8,6.55 ; -5.3,8.4 1.95,8.4 5.3,8.4 ; -2,7.35 -1.2,7.35 ; 6.8,-6.55 6.8,0.1 6.8,6.55
  text "13.1" at 6.55,-0.787 h0.5
  text "10.6" at 1.062,8.65 h0.5
  text "0.8" at -0.6,7.6 h0.5
Mechanical 16:
  circle w0.025: c-4,5.2 r0.4
  region: -5.3,6.55 5.3,6.55 5.3,-6.55 -5.3,-6.55
  lines w0.025: -10.3,-11.55 -10.3,11.55 10.3,11.55 10.3,-11.55 -10.3,-11.55 ; -8.3,-9.55 -8.3,9.55 8.3,9.55 8.3,-9.55 -8.3,-9.55 ; -5.3,-6.55 -5.3,6.55 5.3,6.55 5.3,-6.55 -5.3,-6.55
Mechanical 18:
  text "G5" at -0.87,-0.4 h0.25
  text "A1" at -3.8,4.4 h0.25
  text "D8" at 1.53,2 h0.25
  text "E3" at -2.47,1.2 h0.25
  text "E4" at -1.67,1.2 h0.25
  text "E5" at -0.87,1.2 h0.25
  text "E6" at -0.07,1.2 h0.25
  text "E7" at 0.73,1.2 h0.25
  text "E8" at 1.53,1.2 h0.25
  text "F3" at -2.47,0.4 h0.25
  text "F4" at -1.67,0.4 h0.25
  text "F5" at -0.87,0.4 h0.25
  text "A2" at -3,4.4 h0.25
  text "F6" at -0.07,0.4 h0.25
  text "F8" at 1.53,0.4 h0.25
  text "G3" at -2.47,-0.4 h0.25
  text "G8" at 1.53,-0.4 h0.25
  text "L1" at -3.8,-3.6 h0.25
  text "L2" at -3,-3.6 h0.25
  text "A9" at 2.6,4.4 h0.25
  text "L9" at 2.6,-3.6 h0.25
  text "L10" at 3.3,-3.6 h0.25
  text "M1" at -3.8,-4.4 h0.25
  text "M2" at -3,-4.4 h0.25
  text "M9" at 2.6,-4.4 h0.25
  text "M10" at 3.3,-4.4 h0.25
  text "A10" at 3.3,4.4 h0.25
  text "B1" at -3.8,3.6 h0.25
  text "B9" at 2.6,3.6 h0.25
  text "B10" at 3.3,3.6 h0.25
  text "D6" at -0.07,2 h0.25
  text "D7" at 0.73,2 h0.25
  text "D4" at -1.67,2 h0.25
  text "C3" at -2.47,2.8 h0.25
  text "K8" at 1.53,-2.8 h0.25
  text "K3" at -2.47,-2.8 h0.25
  text "F7" at 0.73,0.4 h0.25
  text "C5" at -0.87,2.8 h0.25
  text "C6" at -0.07,2.8 h0.25
  text "C8" at 1.53,2.8 h0.25
  text "C7" at 0.73,2.8 h0.25
  text "D5" at -0.87,2 h0.25
  text "J6" at -0.07,-2 h0.25
  text "H8" at 1.53,-1.2 h0.25
  text "G4" at -1.67,-0.4 h0.25
  text "D3" at -2.47,2 h0.25
  text "G7" at 0.73,-0.4 h0.25
  text "H7" at 0.73,-1.2 h0.25
  text "G6" at -0.07,-0.4 h0.25
  text "H6" at -0.07,-1.2 h0.25
  text "J5" at -0.87,-2 h0.25
  text "H5" at -0.87,-1.2 h0.25
  text "J3" at -2.47,-2 h0.25
  text "H3" at -2.47,-1.2 h0.25
  text "J8" at 1.53,-2 h0.25
  text "K7" at 0.73,-2.8 h0.25
  text "J7" at 0.73,-2 h0.25
  text "K6" at -0.07,-2.8 h0.25
  text "K5" at -0.87,-2.8 h0.25
  text "K4" at -1.67,-2.8 h0.25
  text "J4" at -1.67,-2 h0.25
  text "H4" at -1.67,-1.2 h0.25
  text "C4" at -1.67,2.8 h0.25
Mechanical 29:
  text "3MM" at -8.05,-9.417 h0.5
  text "5MM" at -9.95,-11.267 h0.5

## FBGA484 [mm] "BGA, 484-Leads, Body 23x23mm, Pitch 1mm"
height 3.5
pads (484):
  round 0.5 smd: A1(-10.5,10.5) A2(-9.5,10.5) A3(-8.5,10.5) A4(-7.5,10.5) A5(-6.5,10.5) A6(-5.5,10.5) A7(-4.5,10.5) A8(-3.5,10.5) A9(-2.5,10.5) A10(-1.5,10.5) A11(-0.5,10.5) A12(0.5,10.5) A13(1.5,10.5) A14(2.5,10.5) A15(3.5,10.5) A16(4.5,10.5) A17(5.5,10.5) A18(6.5,10.5) A19(7.5,10.5) A20(8.5,10.5) A21(9.5,10.5) A22(10.5,10.5) AA1(-10.5,-9.5) AA2(-9.5,-9.5) AA3(-8.5,-9.5) AA4(-7.5,-9.5) AA5(-6.5,-9.5) AA6(-5.5,-9.5) AA7(-4.5,-9.5) AA8(-3.5,-9.5) AA9(-2.5,-9.5) AA10(-1.5,-9.5) AA11(-0.5,-9.5) AA12(0.5,-9.5) AA13(1.5,-9.5) AA14(2.5,-9.5) AA15(3.5,-9.5) AA16(4.5,-9.5) AA17(5.5,-9.5) AA18(6.5,-9.5) AA19(7.5,-9.5) AA20(8.5,-9.5) AA21(9.5,-9.5) AA22(10.5,-9.5) AB1(-10.5,-10.5) AB2(-9.5,-10.5) AB3(-8.5,-10.5) AB4(-7.5,-10.5) AB5(-6.5,-10.5) AB6(-5.5,-10.5) AB7(-4.5,-10.5) AB8(-3.5,-10.5) AB9(-2.5,-10.5) AB10(-1.5,-10.5) AB11(-0.5,-10.5) AB12(0.5,-10.5) AB13(1.5,-10.5) AB14(2.5,-10.5) AB15(3.5,-10.5) AB16(4.5,-10.5) AB17(5.5,-10.5) AB18(6.5,-10.5) AB19(7.5,-10.5) AB20(8.5,-10.5) AB21(9.5,-10.5) AB22(10.5,-10.5) B1(-10.5,9.5) B2(-9.5,9.5) B3(-8.5,9.5) B4(-7.5,9.5) B5(-6.5,9.5) B6(-5.5,9.5) B7(-4.5,9.5) B8(-3.5,9.5) B9(-2.5,9.5) B10(-1.5,9.5) B11(-0.5,9.5) B12(0.5,9.5) B13(1.5,9.5) B14(2.5,9.5) B15(3.5,9.5) B16(4.5,9.5) B17(5.5,9.5) B18(6.5,9.5) B19(7.5,9.5) B20(8.5,9.5) B21(9.5,9.5) B22(10.5,9.5) C1(-10.5,8.5) C2(-9.5,8.5) C3(-8.5,8.5) C4(-7.5,8.5) C5(-6.5,8.5) C6(-5.5,8.5) C7(-4.5,8.5) C8(-3.5,8.5) C9(-2.5,8.5) C10(-1.5,8.5) C11(-0.5,8.5) C12(0.5,8.5) C13(1.5,8.5) C14(2.5,8.5) C15(3.5,8.5) C16(4.5,8.5) C17(5.5,8.5) C18(6.5,8.5) C19(7.5,8.5) C20(8.5,8.5) C21(9.5,8.5) C22(10.5,8.5) D1(-10.5,7.5) D2(-9.5,7.5) D3(-8.5,7.5) D4(-7.5,7.5) D5(-6.5,7.5) D6(-5.5,7.5) D7(-4.5,7.5) D8(-3.5,7.5) D9(-2.5,7.5) D10(-1.5,7.5) D11(-0.5,7.5) D12(0.5,7.5) D13(1.5,7.5) D14(2.5,7.5) D15(3.5,7.5) D16(4.5,7.5) D17(5.5,7.5) D18(6.5,7.5) D19(7.5,7.5) D20(8.5,7.5) D21(9.5,7.5) D22(10.5,7.5) E1(-10.5,6.5) E2(-9.5,6.5) E3(-8.5,6.5) E4(-7.5,6.5) E5(-6.5,6.5) E6(-5.5,6.5) E7(-4.5,6.5) E8(-3.5,6.5) E9(-2.5,6.5) E10(-1.5,6.5) E11(-0.5,6.5) E12(0.5,6.5) E13(1.5,6.5) E14(2.5,6.5) E15(3.5,6.5) E16(4.5,6.5) E17(5.5,6.5) E18(6.5,6.5) E19(7.5,6.5) E20(8.5,6.5) E21(9.5,6.5) E22(10.5,6.5) F1(-10.5,5.5) F2(-9.5,5.5) F3(-8.5,5.5) F4(-7.5,5.5) F5(-6.5,5.5) F6(-5.5,5.5) F7(-4.5,5.5) F8(-3.5,5.5) F9(-2.5,5.5) F10(-1.5,5.5) F11(-0.5,5.5) F12(0.5,5.5) F13(1.5,5.5) F14(2.5,5.5) F15(3.5,5.5) F16(4.5,5.5) F17(5.5,5.5) F18(6.5,5.5) F19(7.5,5.5) F20(8.5,5.5) F21(9.5,5.5) F22(10.5,5.5) G1(-10.5,4.5) G2(-9.5,4.5) G3(-8.5,4.5) G4(-7.5,4.5) G5(-6.5,4.5) G6(-5.5,4.5) G7(-4.5,4.5) G8(-3.5,4.5) G9(-2.5,4.5) G10(-1.5,4.5) G11(-0.5,4.5) G12(0.5,4.5) G13(1.5,4.5) G14(2.5,4.5) G15(3.5,4.5) G16(4.5,4.5) G17(5.5,4.5) G18(6.5,4.5) G19(7.5,4.5) G20(8.5,4.5) G21(9.5,4.5) G22(10.5,4.5) H1(-10.5,3.5) H2(-9.5,3.5) H3(-8.5,3.5) H4(-7.5,3.5) H5(-6.5,3.5) H6(-5.5,3.5) H7(-4.5,3.5) H8(-3.5,3.5) H9(-2.5,3.5) H10(-1.5,3.5) H11(-0.5,3.5) H12(0.5,3.5) H13(1.5,3.5) H14(2.5,3.5) H15(3.5,3.5) H16(4.5,3.5) H17(5.5,3.5) H18(6.5,3.5) H19(7.5,3.5) H20(8.5,3.5) H21(9.5,3.5) H22(10.5,3.5) J1(-10.5,2.5) J2(-9.5,2.5) J3(-8.5,2.5) J4(-7.5,2.5) J5(-6.5,2.5) J6(-5.5,2.5) J7(-4.5,2.5) J8(-3.5,2.5) J9(-2.5,2.5) J10(-1.5,2.5) J11(-0.5,2.5) J12(0.5,2.5) J13(1.5,2.5) J14(2.5,2.5) J15(3.5,2.5) J16(4.5,2.5) J17(5.5,2.5) J18(6.5,2.5) J19(7.5,2.5) J20(8.5,2.5) J21(9.5,2.5) J22(10.5,2.5) K1(-10.5,1.5) K2(-9.5,1.5) K3(-8.5,1.5) K4(-7.5,1.5) K5(-6.5,1.5) K6(-5.5,1.5) K7(-4.5,1.5) K8(-3.5,1.5) K9(-2.5,1.5) K10(-1.5,1.5) K11(-0.5,1.5) K12(0.5,1.5) K13(1.5,1.5) K14(2.5,1.5) K15(3.5,1.5) K16(4.5,1.5) K17(5.5,1.5) K18(6.5,1.5) K19(7.5,1.5) K20(8.5,1.5) K21(9.5,1.5) K22(10.5,1.5) L1(-10.5,0.5) L2(-9.5,0.5) L3(-8.5,0.5) L4(-7.5,0.5) L5(-6.5,0.5) L6(-5.5,0.5) L7(-4.5,0.5) L8(-3.5,0.5) L9(-2.5,0.5) L10(-1.5,0.5) L11(-0.5,0.5) L12(0.5,0.5) L13(1.5,0.5) L14(2.5,0.5) L15(3.5,0.5) L16(4.5,0.5) L17(5.5,0.5) L18(6.5,0.5) L19(7.5,0.5) L20(8.5,0.5) L21(9.5,0.5) L22(10.5,0.5) M1(-10.5,-0.5) M2(-9.5,-0.5) M3(-8.5,-0.5) M4(-7.5,-0.5) M5(-6.5,-0.5) M6(-5.5,-0.5) M7(-4.5,-0.5) M8(-3.5,-0.5) M9(-2.5,-0.5) M10(-1.5,-0.5) M11(-0.5,-0.5) M12(0.5,-0.5) M13(1.5,-0.5) M14(2.5,-0.5) M15(3.5,-0.5) M16(4.5,-0.5) M17(5.5,-0.5) M18(6.5,-0.5) M19(7.5,-0.5) M20(8.5,-0.5) M21(9.5,-0.5) M22(10.5,-0.5) N1(-10.5,-1.5) N2(-9.5,-1.5) N3(-8.5,-1.5) N4(-7.5,-1.5) N5(-6.5,-1.5) N6(-5.5,-1.5) N7(-4.5,-1.5) N8(-3.5,-1.5) N9(-2.5,-1.5) N10(-1.5,-1.5) N11(-0.5,-1.5) N12(0.5,-1.5) N13(1.5,-1.5) N14(2.5,-1.5) N15(3.5,-1.5) N16(4.5,-1.5) N17(5.5,-1.5) N18(6.5,-1.5) N19(7.5,-1.5) N20(8.5,-1.5) N21(9.5,-1.5) N22(10.5,-1.5) P1(-10.5,-2.5) P2(-9.5,-2.5) P3(-8.5,-2.5) P4(-7.5,-2.5) P5(-6.5,-2.5) P6(-5.5,-2.5) P7(-4.5,-2.5) P8(-3.5,-2.5) P9(-2.5,-2.5) P10(-1.5,-2.5) P11(-0.5,-2.5) P12(0.5,-2.5) P13(1.5,-2.5) P14(2.5,-2.5) P15(3.5,-2.5) P16(4.5,-2.5) P17(5.5,-2.5) P18(6.5,-2.5) P19(7.5,-2.5) P20(8.5,-2.5) P21(9.5,-2.5) P22(10.5,-2.5) R1(-10.5,-3.5) R2(-9.5,-3.5) R3(-8.5,-3.5) R4(-7.5,-3.5) R5(-6.5,-3.5) R6(-5.5,-3.5) R7(-4.5,-3.5) R8(-3.5,-3.5) R9(-2.5,-3.5) R10(-1.5,-3.5) R11(-0.5,-3.5) R12(0.5,-3.5) R13(1.5,-3.5) R14(2.5,-3.5) R15(3.5,-3.5) R16(4.5,-3.5) R17(5.5,-3.5) R18(6.5,-3.5) R19(7.5,-3.5) R20(8.5,-3.5) R21(9.5,-3.5) R22(10.5,-3.5) T1(-10.5,-4.5) T2(-9.5,-4.5) T3(-8.5,-4.5) T4(-7.5,-4.5) T5(-6.5,-4.5) T6(-5.5,-4.5) T7(-4.5,-4.5) T8(-3.5,-4.5) T9(-2.5,-4.5) T10(-1.5,-4.5) T11(-0.5,-4.5) T12(0.5,-4.5) T13(1.5,-4.5) T14(2.5,-4.5) T15(3.5,-4.5) T16(4.5,-4.5) T17(5.5,-4.5) T18(6.5,-4.5) T19(7.5,-4.5) T20(8.5,-4.5) T21(9.5,-4.5) T22(10.5,-4.5) U1(-10.5,-5.5) U2(-9.5,-5.5) U3(-8.5,-5.5) U4(-7.5,-5.5) U5(-6.5,-5.5) U6(-5.5,-5.5) U7(-4.5,-5.5) U8(-3.5,-5.5) U9(-2.5,-5.5) U10(-1.5,-5.5) U11(-0.5,-5.5) U12(0.5,-5.5) U13(1.5,-5.5) U14(2.5,-5.5) U15(3.5,-5.5) U16(4.5,-5.5) U17(5.5,-5.5) U18(6.5,-5.5) U19(7.5,-5.5) U20(8.5,-5.5) U21(9.5,-5.5) U22(10.5,-5.5) V1(-10.5,-6.5) V2(-9.5,-6.5) V3(-8.5,-6.5) V4(-7.5,-6.5) V5(-6.5,-6.5) V6(-5.5,-6.5) V7(-4.5,-6.5) V8(-3.5,-6.5) V9(-2.5,-6.5) V10(-1.5,-6.5) V11(-0.5,-6.5) V12(0.5,-6.5) V13(1.5,-6.5) V14(2.5,-6.5) V15(3.5,-6.5) V16(4.5,-6.5) V17(5.5,-6.5) V18(6.5,-6.5) V19(7.5,-6.5) V20(8.5,-6.5) V21(9.5,-6.5) V22(10.5,-6.5) W1(-10.5,-7.5) W2(-9.5,-7.5) W3(-8.5,-7.5) W4(-7.5,-7.5) W5(-6.5,-7.5) W6(-5.5,-7.5) W7(-4.5,-7.5) W8(-3.5,-7.5) W9(-2.5,-7.5) W10(-1.5,-7.5) W11(-0.5,-7.5) W12(0.5,-7.5) W13(1.5,-7.5) W14(2.5,-7.5) W15(3.5,-7.5) W16(4.5,-7.5) W17(5.5,-7.5) W18(6.5,-7.5) W19(7.5,-7.5) W20(8.5,-7.5) W21(9.5,-7.5) W22(10.5,-7.5) Y1(-10.5,-8.5) Y2(-9.5,-8.5) Y3(-8.5,-8.5) Y4(-7.5,-8.5) Y5(-6.5,-8.5) Y6(-5.5,-8.5) Y7(-4.5,-8.5) Y8(-3.5,-8.5) Y9(-2.5,-8.5) Y10(-1.5,-8.5) Y11(-0.5,-8.5) Y12(0.5,-8.5) Y13(1.5,-8.5) Y14(2.5,-8.5) Y15(3.5,-8.5) Y16(4.5,-8.5) Y17(5.5,-8.5) Y18(6.5,-8.5) Y19(7.5,-8.5) Y20(8.5,-8.5) Y21(9.5,-8.5) Y22(10.5,-8.5)
Top Overlay:
  circle w0.25: c-12.15,10.5 r0.125
  region: -10.5,11.5 -11.5,10.5 -11.5,11.5
  lines w0.2: -11.5,10.5 -10.5,11.5 ; -11.5,-11.5 -11.5,11.5 11.5,11.5 11.5,-11.5 -11.5,-11.5
Mechanical 13:
  lines w0.1: -11.5,-11.5 -11.5,11.5 11.5,11.5 11.5,-11.5 -11.5,-11.5
Mechanical 15:
  lines w0.1: -0.5,0 0.5,0 ; 0,-0.5 0,0.5 ; -12.5,-12.5 -12.5,12.5 12.5,12.5 12.5,-12.5 -12.5,-12.5
3D body: height 3.5, standoff 0, extent -11.5,-11.5 11.5,11.5